# Altium footprint library Pcblib.PcbLib: 281 footprints (part 3 of 18)
Each footprint in its own frame and in the unit in brackets; x right, y up, seen from the top. Pads: shape width x height; smd on the part's side, far side on the other; paste and mask are expansions set on the pad; w line width, h text height; cw(c..) or ccw(c..) is an arc to the next point about the centre after c.
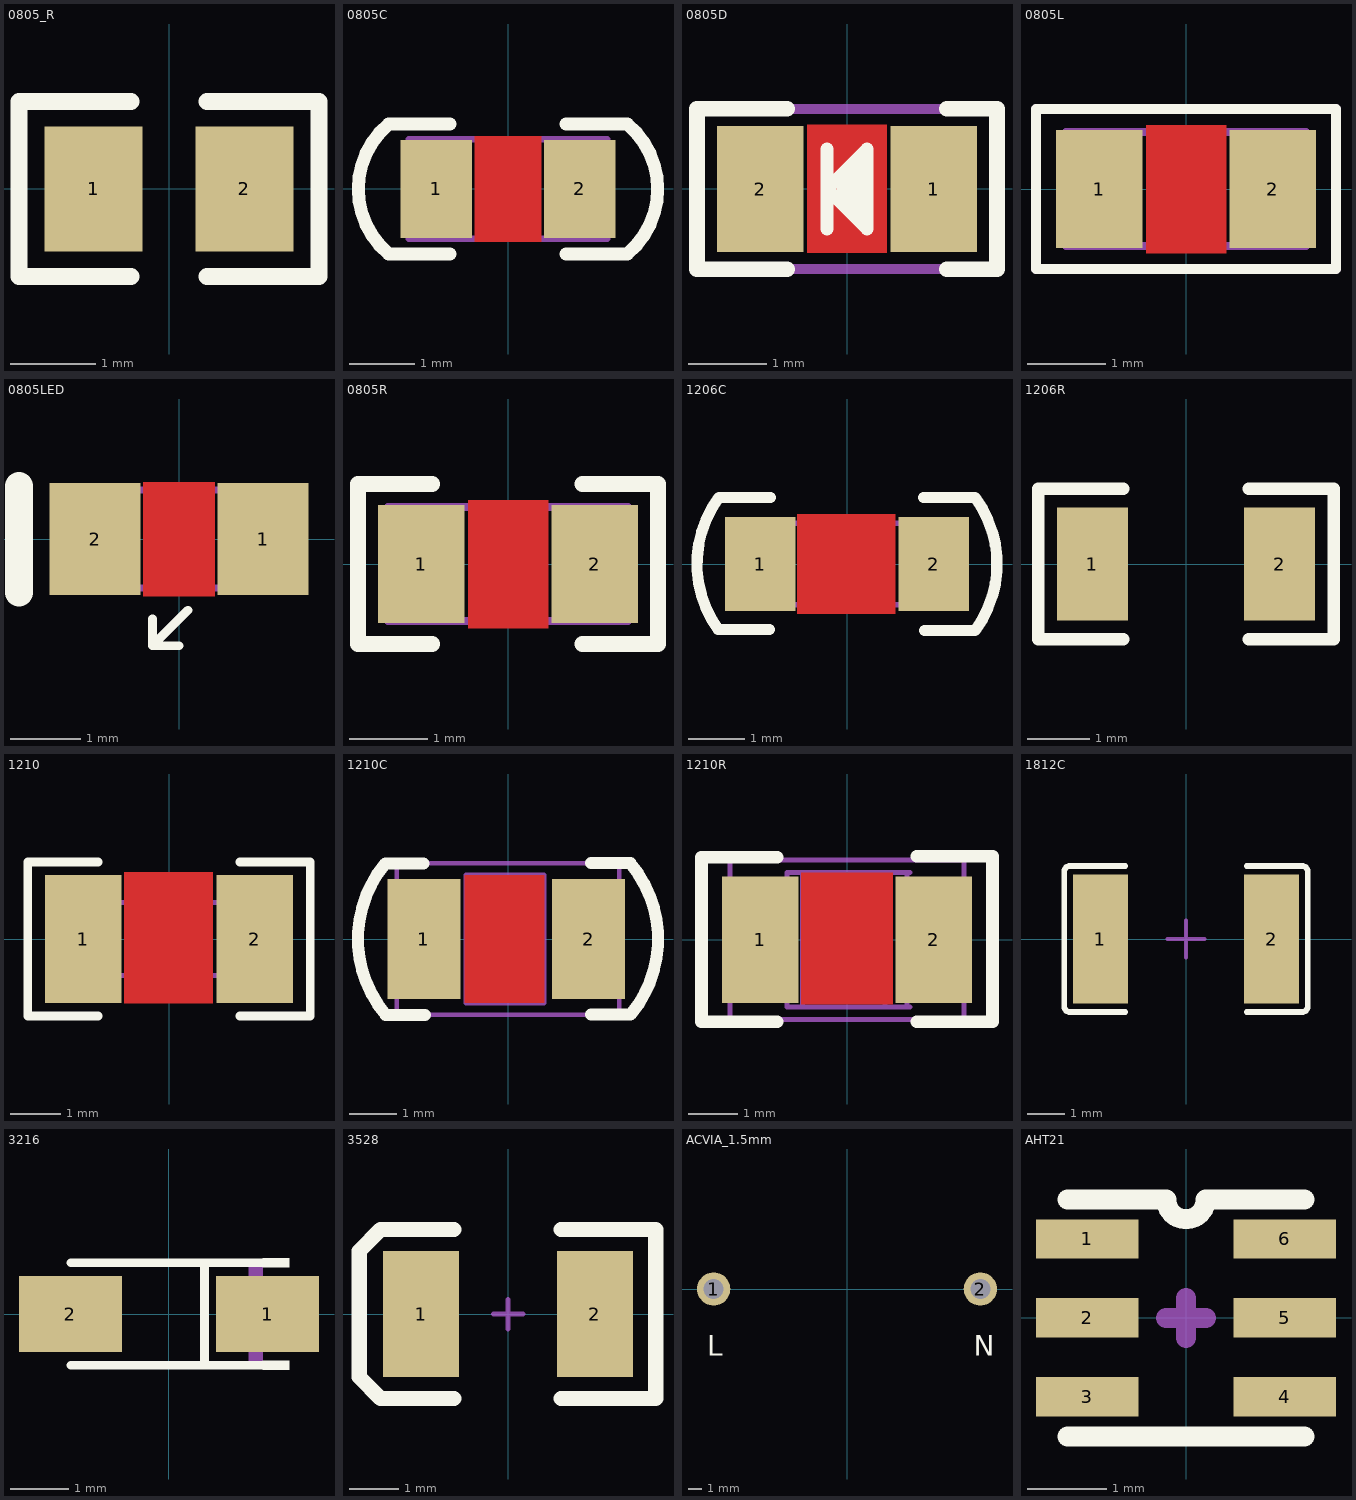
[diagram p2: the footprints below, top view; thin cyan lines are the x and y axes]

## 0805_R [mm]
pads (2):
  rect 1.16x1.47 smd: 1(-0.89,0) 2(0.89,0)
Top Overlay:
  lines w0.2: -0.45,-1.035 -1.77,-1.035 -1.77,1.035 -0.45,1.035 ; 0.45,-1.035 1.77,-1.035 1.77,1.035 0.45,1.035
3D body "User Library-R_0805.STEP": height 0.49, standoff -0.01, extent -0.997,-0.625 1.003,0.625

## 0805C [mm]
height 0.8
pads (2):
  rect 1.1x1.5 smd: 1(-1.1,0) 2(1.1,0)
Top Layer:
  pour cut-out: -0.508,0.813 0.508,0.813 0.508,-0.813 -0.508,-0.813
Top Overlay:
  lines w0.2: -1.836,-1 -0.889,-1 ; -1.836,-0.996 cw(c-1,0) -1.836,0.996 ; -1.836,1 -0.889,1 ; 0.889,-1 1.8,-1 ; 0.889,1 1.836,1 ; 1.836,-0.996 ccw(c1,0) 1.836,0.996
Mechanical 5:
  lines w0.127: -1.801,-1.021 cw(c-1.04,-0.011) -1.778,1.016 -0.889,1.016 ; -1.778,-1.016 -0.889,-1.016 ; 0.889,-1.016 1.778,-1.016 ccw(c1.04,0.011) 1.801,1.021 ; 0.889,1.016 1.778,1.016
Mechanical 13:
  lines w0.1: -1.075,-0.762 -1.075,0.765 ; 1.075,-0.762 1.075,0.765 ; -1.524,-0.762 1.524,-0.762 1.524,0.765 -1.524,0.765 -1.524,-0.762
Mechanical 15:
  lines w0.1: -0.254,0 0.254,0 ; 0,-0.254 0,0.254
3D body: height 1.1, standoff 0, extent -1.524,-0.762 -1.075,0.765
3D body: height 1.1, standoff 0, extent -1.075,-0.762 1.075,0.765
3D body: height 1.1, standoff 0, extent 1.075,-0.762 1.524,0.765

## 0805D [mm]
height 1.6
pads (2):
  rect 1.1x1.6 smd: 1(1.1,0) 2(-1.1,0)
Top Layer:
  pour cut-out: -0.508,0.813 0.508,0.813 0.508,-0.813 -0.508,-0.813
Top Overlay:
  lines w0.16: -0.254,-0.508 -0.254,0.508 ; -0.053,-0.201 -0.053,0.201 ; 0.101,-0.355 0.101,0.355 ; -0.254,0 0.254,0.508 0.254,-0.508 -0.254,0
  lines w0.2: -0.762,-1.02 -1.905,-1.02 -1.905,1.02 -0.762,1.02 ; 1.27,-1.02 1.905,-1.02 1.905,1.02 1.27,1.02
Mechanical 5:
  lines w0.127: -1.905,-1.016 -1.905,1.016 1.905,1.016 1.905,-1.016 -1.905,-1.016
Mechanical 15:
  lines w0.1: -0.295,0 0.305,0 ; 0,-0.305 0,0.295 ; 0,-0.3 0,0.3
3D body: height 1.1, standoff 0, extent -0.981,-0.889 1.362,0.877
3D body: height 1.1, standoff 0, extent -1.494,-0.889 -0.981,0.877

## 0805L [mm]
height 0.8
pads (2):
  rect 1.1x1.5 smd: 1(-1.1,0) 2(1.1,0)
Top Layer:
  pour cut-out: -0.508,0.813 0.508,0.813 0.508,-0.813 -0.508,-0.813
Top Overlay:
  lines w0.127: -1.905,0.991 -1.905,-1.016 -0.962,-1.016 ; -1.905,1.016 1.905,1.016 1.905,-1.016 -1.041,-1.016
Mechanical 5:
  lines w0.127: -1.88,-1.016 1.905,-1.016 1.905,1.016 -1.245,1.016 ; -1.015,-1.016 -1.905,-1.016 -1.905,1.016 -1.015,1.016
Mechanical 13:
  lines w0.1: -1.524,0.675 -1.524,-0.724 1.524,-0.724 ; -1.524,0.724 1.524,0.724 1.524,-0.675 ; -1.099,-0.724 -1.099,0.675 ; 1.1,-0.724 1.1,0.7
Mechanical 15:
  lines w0.1: -0.3,0 0.3,0 ; 0,-0.3 0,0.3
3D body: height 1.1, standoff 0, extent -1.524,-0.724 -1.075,0.724
3D body: height 1.1, standoff 0, extent -1.099,-0.724 1.1,0.724
3D body: height 1.1, standoff 0, extent 1.075,-0.724 1.524,0.724

## 0805LED [mm]
height 1
pads (2):
  rect 1.3x1.6 smd: 1(1.2,0) 2(-1.2,0)
Top Layer:
  pour cut-out: -0.508,0.813 0.508,0.813 0.508,-0.813 -0.508,-0.813
Top Overlay:
  lines w0.127: -0.381,-1.143 -0.381,-1.524 ; 0,-1.524 -0.381,-1.524 ; 0.127,-1.016 -0.381,-1.524
  lines w0.4: -2.286,-0.762 -2.286,0.762
Mechanical 13:
  lines w0.1: -0.65,-0.7 -0.65,0.7 ; 0.65,-0.7 0.65,0.7 ; -1.1,-0.7 1.1,-0.7 1.1,0.7 -1.1,0.7 -1.1,-0.7
Mechanical 15:
  lines w0.1: -0.3,0 0.3,0 ; 0,-0.3 0,0.3
3D body: height 1.1, standoff 0, extent 0.651,-0.75 1.099,0.699
3D body: height 1.1, standoff 0, extent -1.411,-0.889 1.397,0.889
3D body: height 1.1, standoff 0, extent -1.099,-0.75 -0.651,0.699

## 0805R [mm]
height 0.8
pads (2):
  rect 1.1x1.5 smd: 1(-1.1,0) 2(1.1,0)
Top Layer:
  pour cut-out: -0.508,0.813 0.508,0.813 0.508,-0.813 -0.508,-0.813
Top Overlay:
  lines w0.2: -0.962,-1.016 -1.905,-1.016 -1.905,1.016 -0.962,1.016 ; 0.946,-1.016 1.905,-1.016 1.905,1.016 0.946,1.016
Mechanical 5:
  lines w0.127: -1.015,-1.016 -1.905,-1.016 -1.905,1.016 -1.015,1.016 ; 1.015,-1.016 1.905,-1.016 1.905,1.016 1.015,1.016
Mechanical 13:
  lines w0.1: -1.524,0.675 -1.524,-0.724 1.524,-0.724 ; -1.524,0.724 1.524,0.724 1.524,-0.675 ; -1.099,-0.724 -1.099,0.675 ; 1.1,-0.724 1.1,0.7
Mechanical 15:
  lines w0.1: -0.3,0 0.3,0 ; 0,-0.3 0,0.3
3D body: height 1.1, standoff 0, extent -1.524,-0.724 -1.075,0.724
3D body: height 1.1, standoff 0, extent -1.099,-0.724 1.1,0.724
3D body: height 1.1, standoff 0, extent 1.075,-0.724 1.524,0.724

## 1206C [mm]
height 1.1
pads (2):
  rect 1.26x1.68 smd: 1(-1.55,0) 2(1.55,0)
Top Layer:
  pour cut-out: -0.889,0.889 0.864,0.889 0.864,-0.889 -0.889,-0.889
Top Overlay:
  lines w0.2: -1.386,-1.169 -2.303,-1.169 cw(c-0.68,0) -2.288,1.189 -1.372,1.189 ; 1.365,1.189 2.288,1.189 cw(c0.68,0) 2.288,-1.189 1.391,-1.189
Mechanical 13:
  lines w0.1: -0.65,-0.725 -0.65,0.725 ; 0.65,-0.725 0.65,0.725 ; -1.1,-0.725 -1.1,0.725 1.1,0.725 1.1,-0.725 -1.1,-0.725
Mechanical 15:
  lines w0.1: -0.295,0 0.305,0 ; 0,-0.305 0,0.295
3D body: height 1.1, standoff 0, extent 0.651,-0.724 1.099,0.724
3D body: height 1.1, standoff 0, extent -1.099,-0.724 -0.651,0.724
3D body: height 1.1, standoff 0, extent -1.284,-0.889 1.27,0.889

## 1206R [mm]
pads (2):
  rect 1.13x1.8 smd: 1(-1.49,0) 2(1.49,0)
Top Overlay:
  lines w0.2: -1,-1.2 -2.355,-1.2 -2.355,1.2 -1,1.2 ; 1,-1.2 2.355,-1.2 2.355,1.2 1,1.2
3D body "User Library-RES_3216-1206.STEP": height 0.85, standoff 0, extent -1.7,-0.864 1.65,0.866

## 1210 [mm]
pads (2):
  rect 1.52x2.54 smd: 1(-1.7,0) 2(1.7,0)
Top Layer:
  pour cut-out: -0.889,1.321 0.864,1.321 0.864,-1.27 -0.889,-1.27
Top Overlay:
  lines w0.17: -1.397,-1.524 -2.794,-1.524 -2.794,1.524 -1.397,1.524 ; 1.397,-1.524 2.794,-1.524 2.794,1.524 1.397,1.524
Mechanical 5:
  lines w0.1: -1.397,-1.524 -2.794,-1.524 -2.794,1.524 -1.397,1.524 ; 1.397,-1.524 2.794,-1.524 2.794,1.524 1.397,1.524
Mechanical 13:
  lines w0.1: -1.016,-0.725 -1.016,0.725 ; 1.016,-0.725 1.016,0.725 ; -1.651,-0.725 1.651,-0.725 1.651,0.725 -1.651,0.725 -1.651,-0.725
Mechanical 15:
  lines w0.1: -0.295,0 0.305,0 ; 0,-0.305 0,0.295
3D body: height 1.9, standoff 0, extent -2.032,-1.27 2.032,1.27

## 1210C [mm] "1210 from SM-752 data"
height 1.35
pads (2):
  rect 1.54x2.54 smd: 1(-1.778,0) 2(1.702,0)
Top Layer:
  pour cut-out: -0.914,1.346 0.762,1.346 0.762,-1.346 -0.914,-1.346
Top Overlay:
  lines w0.254: -1.78,1.599 -2.585,1.599 ccw(c-0.68,0) -2.582,-1.602 -1.757,-1.602 ; 1.757,-1.599 2.585,-1.599 ccw(c0.68,0) 2.582,1.602 1.757,1.602
Mechanical 5:
  lines w0.1: -0.889,-1.35 -0.889,1.35 0.762,1.35 0.762,-1.35 -0.889,-1.35
Mechanical 13:
  lines w0.1: -0.889,-1.35 -0.889,1.35 0.762,1.35 0.762,-1.349 -0.889,-1.35
Mechanical 15:
  lines w0.1: -0.5,0 0.5,0 ; 0,-0.5 0,0.5 ; -2.35,-1.6 2.35,-1.6 2.35,1.6 -2.35,1.6 -2.35,-1.6
3D body: height 1.35, standoff 0, extent -0.889,-1.349 0.762,1.349

## 1210R [mm] "1210 from SM-752 data"
height 0.55
pads (2):
  rect 1.54x2.54 smd: 1(-1.74,0) 2(1.74,0)
Top Layer:
  pour cut-out: -0.914,1.346 0.914,1.346 0.914,-1.295 -0.914,-1.295
Top Overlay:
  lines w0.254: -1.397,-1.651 -2.921,-1.651 -2.921,1.651 -1.397,1.651 ; 1.397,-1.651 2.921,-1.651 2.921,1.676 1.397,1.676
Mechanical 5:
  lines w0.1: -0.889,-1.35 0.762,-1.35 0.762,1.35 -0.889,1.35 -0.889,-1.35
Mechanical 13:
  lines w0.1: 1.2,-1.35 1.2,1.35 ; 1.261,-1.35 -1.2,-1.35 -1.2,1.35 1.261,1.35
Mechanical 15:
  lines w0.1: -0.5,0 0.5,0 ; 0,-0.5 0,0.5 ; -2.35,-1.6 -2.35,1.6 2.35,1.6 2.35,-1.6 -2.35,-1.6
3D body: height 1.35, standoff 0, extent -1.261,-1.349 -0.762,1.349
3D body: height 1.35, standoff 0, extent -0.762,-1.349 0.762,1.349
3D body: height 1.35, standoff 0, extent 0.762,-1.349 1.261,1.349

## 1812C [mm]
pads (2):
  rect 1.485x3.456 smd: 1(-2.293,0) 2(2.293,0)
Top Overlay:
  lines w0.152: -1.626,-1.957 -3.111,-1.957 cw(c-3.111,-1.804) -3.264,-1.804 -3.264,1.804 cw(c-3.111,1.804) -3.111,1.957 -1.626,1.957 ; 1.626,-1.957 3.111,-1.957 ccw(c3.111,-1.804) 3.264,-1.804 3.264,1.804 ccw(c3.111,1.804) 3.111,1.957 1.626,1.957
Top Paste:
  region: 1.55,-1.628 1.55,-0.688 1.65,-0.588 1.955,-0.588 2.055,-0.488 2.055,0.488 1.955,0.588 1.65,0.588 1.55,0.688 1.55,1.628 1.65,1.728 2.935,1.728 3.035,1.628 3.035,-1.628 2.935,-1.728 1.65,-1.728
  region: -1.55,-1.628 -1.55,-0.688 -1.65,-0.588 -1.955,-0.588 -2.055,-0.488 -2.055,0.488 -1.955,0.588 -1.65,0.588 -1.55,0.688 -1.55,1.628 -1.65,1.728 -2.935,1.728 -3.035,1.628 -3.035,-1.628 -2.935,-1.728 -1.65,-1.728
Mechanical 15:
  lines w0.1: -0.5,0 0.5,0 ; 0,-0.5 0,0.5

## 3216 [mm]
pads (2):
  rect 1.758x1.296 smd: 1(1.686,0) 2(-1.686,0)
Top Overlay:
  region: 1.6,0.952 1.6,0.8 2.057,0.8 2.057,0.952
  region: 1.6,-0.952 1.6,-0.8 2.057,-0.8 2.057,-0.952
  lines w0.152: -1.676,-0.876 1.676,-0.876 ; -1.676,0.876 1.676,0.876 ; 0.604,-0.876 0.604,0.876
Mechanical 15:
  region: -1.48,-0.06 -1.48,0.06 -1,0.06 -1,-0.06
  region: 1.48,-0.06 1.48,0.06 1,0.06 1,-0.06
  region: 1.3,-0.4 1.3,0.4 1.18,0.4 1.18,-0.4
  region: 1.6,-0.8 1.6,-0.4 1.36,-0.4 1.36,-0.8
  region: 1.6,0.8 1.6,0.4 1.36,0.4 1.36,0.8

## 3528 [mm]
height 1.35
pads (2):
  rect 1.524x2.54 smd: 1(-1.75,0) 2(1.75,0)
Top Overlay:
  lines w0.305: -1.09,-1.7 -2.565,-1.7 -2.995,-1.27 -2.995,1.27 -2.565,1.7 -1.09,1.7 ; 1.069,-1.7 2.974,-1.7 2.974,1.7 1.069,1.7
Mechanical 15:
  lines w0.1: -0.295,0 0.305,0 ; 0,-0.305 0,0.295
3D body: height 1.35, standoff 0, extent -1.778,-1.27 1.778,1.27

## ACVIA_1.5mm [mm]
pads (2):
  round 2.5 hole 1.5: 1(-10,0) 2(10,0)
Top Overlay:
  text "L" at -10.5,-5 h1.52
  text "N" at 9.5,-5 h1.52

## AHT21 [mm]
pads (6):
  rect 1.3x0.5 smd: 1(-1.25,1) 2(-1.25,0) 3(-1.25,-1) 4(1.25,-1) 5(1.25,0) 6(1.25,1)
Top Overlay:
  lines w0.254: -1.5,-1.5 1.5,-1.5 ; -1.5,1.5 -0.25,1.5 ccw(c0,1.5) 0.25,1.5 1.5,1.5
Mechanical 15:
  lines w0.254: -0.254,0 0.254,0 ; 0,-0.254 0,0.254